# Altium footprint library ref-packages-longpad.PCBLIB: 1527 footprints (part 46 of 103) (continued)
## QFP120_SOT349-2 [mm]
pads (120):
  rect 0.6x1.5 smd: 1(-11.6,-16.2) 30(11.6,-16.2) 61(11.6,16.2) 90(-11.6,16.2)
  rect 0.5x1.5 smd: 2(-10.8,-16.2) 3(-10,-16.2) 4(-9.2,-16.2) 5(-8.4,-16.2) 6(-7.6,-16.2) 7(-6.8,-16.2) 8(-6,-16.2) 9(-5.2,-16.2) 10(-4.4,-16.2) 11(-3.6,-16.2) 12(-2.8,-16.2) 13(-2,-16.2) 14(-1.2,-16.2) 15(-0.4,-16.2) 16(0.4,-16.2) 17(1.2,-16.2) 18(2,-16.2) 19(2.8,-16.2) 20(3.6,-16.2) 21(4.4,-16.2) 22(5.2,-16.2) 23(6,-16.2) 24(6.8,-16.2) 25(7.6,-16.2) 26(8.4,-16.2) 27(9.2,-16.2) 28(10,-16.2) 29(10.8,-16.2) 62(10.8,16.2) 63(10,16.2) 64(9.2,16.2) 65(8.4,16.2) 66(7.6,16.2) 67(6.8,16.2) 68(6,16.2) 69(5.2,16.2) 70(4.4,16.2) 71(3.6,16.2) 72(2.8,16.2) 73(2,16.2) 74(1.2,16.2) 75(0.4,16.2) 76(-0.4,16.2) 77(-1.2,16.2) 78(-2,16.2) 79(-2.8,16.2) 80(-3.6,16.2) 81(-4.4,16.2) 82(-5.2,16.2) 83(-6,16.2) 84(-6.8,16.2) 85(-7.6,16.2) 86(-8.4,16.2) 87(-9.2,16.2) 88(-10,16.2) 89(-10.8,16.2)
  rect 1.5x0.6 smd: 31(16.2,-11.6) 60(16.2,11.6) 91(-16.2,11.6) 120(-16.2,-11.6)
  rect 1.5x0.5 smd: 32(16.2,-10.8) 33(16.2,-10) 34(16.2,-9.2) 35(16.2,-8.4) 36(16.2,-7.6) 37(16.2,-6.8) 38(16.2,-6) 39(16.2,-5.2) 40(16.2,-4.4) 41(16.2,-3.6) 42(16.2,-2.8) 43(16.2,-2) 44(16.2,-1.2) 45(16.2,-0.4) 46(16.2,0.4) 47(16.2,1.2) 48(16.2,2) 49(16.2,2.8) 50(16.2,3.6) 51(16.2,4.4) 52(16.2,5.2) 53(16.2,6) 54(16.2,6.8) 55(16.2,7.6) 56(16.2,8.4) 57(16.2,9.2) 58(16.2,10) 59(16.2,10.8) 92(-16.2,10.8) 93(-16.2,10) 94(-16.2,9.2) 95(-16.2,8.4) 96(-16.2,7.6) 97(-16.2,6.8) 98(-16.2,6) 99(-16.2,5.2) 100(-16.2,4.4) 101(-16.2,3.6) 102(-16.2,2.8) 103(-16.2,2) 104(-16.2,1.2) 105(-16.2,0.4) 106(-16.2,-0.4) 107(-16.2,-1.2) 108(-16.2,-2) 109(-16.2,-2.8) 110(-16.2,-3.6) 111(-16.2,-4.4) 112(-16.2,-5.2) 113(-16.2,-6) 114(-16.2,-6.8) 115(-16.2,-7.6) 116(-16.2,-8.4) 117(-16.2,-9.2) 118(-16.2,-10) 119(-16.2,-10.8)
Top Overlay:
  circle w0.203: c-11.8,-11.8 r0.6
  lines w0.203: -14.1,-14.1 14.1,-14.1 14.1,14.1 -14.1,14.1 -14.1,-14.1
Mechanical 16:
  rectangle: -11.8,-16.55 -11.4,-14.2
  rectangle: -11,-16.55 -10.6,-14.2
  rectangle: -10.2,-16.55 -9.8,-14.2
  rectangle: -9.4,-16.55 -9,-14.2
  rectangle: -8.6,-16.55 -8.2,-14.2
  rectangle: -7.8,-16.55 -7.4,-14.2
  rectangle: -7,-16.55 -6.6,-14.2
  rectangle: -6.2,-16.55 -5.8,-14.2
  rectangle: -5.4,-16.55 -5,-14.2
  rectangle: -4.6,-16.55 -4.2,-14.2
  rectangle: -3.8,-16.55 -3.4,-14.2
  rectangle: -3,-16.55 -2.6,-14.2
  rectangle: -2.2,-16.55 -1.8,-14.2
  rectangle: -1.4,-16.55 -1,-14.2
  rectangle: -0.6,-16.55 -0.2,-14.2
  rectangle: 0.2,-16.55 0.6,-14.2
  rectangle: 1,-16.55 1.4,-14.2
  rectangle: 1.8,-16.55 2.2,-14.2
  rectangle: 2.6,-16.55 3,-14.2
  rectangle: 3.4,-16.55 3.8,-14.2
  rectangle: 4.2,-16.55 4.6,-14.2
  rectangle: 5,-16.55 5.4,-14.2
  rectangle: 5.8,-16.55 6.2,-14.2
  rectangle: 6.6,-16.55 7,-14.2
  rectangle: 7.4,-16.55 7.8,-14.2
  rectangle: 8.2,-16.55 8.6,-14.2
  rectangle: 9,-16.55 9.4,-14.2
  rectangle: 9.8,-16.55 10.2,-14.2
  rectangle: 10.6,-16.55 11,-14.2
  rectangle: 11.4,-16.55 11.8,-14.2
  rectangle: 14.2,-11.8 16.55,-11.4
  rectangle: 14.2,-11 16.55,-10.6
  rectangle: 14.2,-10.2 16.55,-9.8
  rectangle: 14.2,-9.4 16.55,-9
  rectangle: 14.2,-8.6 16.55,-8.2
  rectangle: 14.2,-7.8 16.55,-7.4
  rectangle: 14.2,-7 16.55,-6.6
  rectangle: 14.2,-6.2 16.55,-5.8
  rectangle: 14.2,-5.4 16.55,-5
  rectangle: 14.2,-4.6 16.55,-4.2
  rectangle: 14.2,-3.8 16.55,-3.4
  rectangle: 14.2,-3 16.55,-2.6
  rectangle: 14.2,-2.2 16.55,-1.8
  rectangle: 14.2,-1.4 16.55,-1
  rectangle: 14.2,-0.6 16.55,-0.2
  rectangle: 14.2,0.2 16.55,0.6
  rectangle: 14.2,1 16.55,1.4
  rectangle: 14.2,1.8 16.55,2.2
  rectangle: 14.2,2.6 16.55,3
  rectangle: 14.2,3.4 16.55,3.8
  rectangle: 14.2,4.2 16.55,4.6
  rectangle: 14.2,5 16.55,5.4
  rectangle: 14.2,5.8 16.55,6.2
  rectangle: 14.2,6.6 16.55,7
  rectangle: 14.2,7.4 16.55,7.8
  rectangle: 14.2,8.2 16.55,8.6
  rectangle: 14.2,9 16.55,9.4
  rectangle: 14.2,9.8 16.55,10.2
  rectangle: 14.2,10.6 16.55,11
  rectangle: 14.2,11.4 16.55,11.8
  rectangle: 11.4,14.2 11.8,16.55
  rectangle: 10.6,14.2 11,16.55
  rectangle: 9.8,14.2 10.2,16.55
  rectangle: 9,14.2 9.4,16.55
  rectangle: 8.2,14.2 8.6,16.55
  rectangle: 7.4,14.2 7.8,16.55
  rectangle: 6.6,14.2 7,16.55
  rectangle: 5.8,14.2 6.2,16.55
  rectangle: 5,14.2 5.4,16.55
  rectangle: 4.2,14.2 4.6,16.55
  rectangle: 3.4,14.2 3.8,16.55
  rectangle: 2.6,14.2 3,16.55
  rectangle: 1.8,14.2 2.2,16.55
  rectangle: 1,14.2 1.4,16.55
  rectangle: 0.2,14.2 0.6,16.55
  rectangle: -0.6,14.2 -0.2,16.55
  rectangle: -1.4,14.2 -1,16.55
  rectangle: -2.2,14.2 -1.8,16.55
  rectangle: -3,14.2 -2.6,16.55
  rectangle: -3.8,14.2 -3.4,16.55
  rectangle: -4.6,14.2 -4.2,16.55
  rectangle: -5.4,14.2 -5,16.55
  rectangle: -6.2,14.2 -5.8,16.55
  rectangle: -7,14.2 -6.6,16.55
  rectangle: -7.8,14.2 -7.4,16.55
  rectangle: -8.6,14.2 -8.2,16.55
  rectangle: -9.4,14.2 -9,16.55
  rectangle: -10.2,14.2 -9.8,16.55
  rectangle: -11,14.2 -10.6,16.55
  rectangle: -11.8,14.2 -11.4,16.55
  rectangle: -16.55,11.4 -14.2,11.8
  rectangle: -16.55,10.6 -14.2,11
  rectangle: -16.55,9.8 -14.2,10.2
  rectangle: -16.55,9 -14.2,9.4
  rectangle: -16.55,8.2 -14.2,8.6
  rectangle: -16.55,7.4 -14.2,7.8
  rectangle: -16.55,6.6 -14.2,7
  rectangle: -16.55,5.8 -14.2,6.2
  rectangle: -16.55,5 -14.2,5.4
  rectangle: -16.55,4.2 -14.2,4.6
  rectangle: -16.55,3.4 -14.2,3.8
  rectangle: -16.55,2.6 -14.2,3
  rectangle: -16.55,1.8 -14.2,2.2
  rectangle: -16.55,1 -14.2,1.4
  rectangle: -16.55,0.2 -14.2,0.6
  rectangle: -16.55,-0.6 -14.2,-0.2
  rectangle: -16.55,-1.4 -14.2,-1
  rectangle: -16.55,-2.2 -14.2,-1.8
  rectangle: -16.55,-3 -14.2,-2.6
  rectangle: -16.55,-3.8 -14.2,-3.4
  rectangle: -16.55,-4.6 -14.2,-4.2
  rectangle: -16.55,-5.4 -14.2,-5
  rectangle: -16.55,-6.2 -14.2,-5.8
  rectangle: -16.55,-7 -14.2,-6.6
  rectangle: -16.55,-7.8 -14.2,-7.4
  rectangle: -16.55,-8.6 -14.2,-8.2
  rectangle: -16.55,-9.4 -14.2,-9
  rectangle: -16.55,-10.2 -14.2,-9.8
  rectangle: -16.55,-11 -14.2,-10.6
  rectangle: -16.55,-11.8 -14.2,-11.4

## QFP128_SOT320-2 [mm]
pads (128):
  rect 0.6x1.5 smd: 1(-12.4,-15.1) 32(12.4,-15.1) 65(12.4,15.1) 96(-12.4,15.1)
  rect 0.5x1.5 smd: 2(-11.6,-15.1) 3(-10.8,-15.1) 4(-10,-15.1) 5(-9.2,-15.1) 6(-8.4,-15.1) 7(-7.6,-15.1) 8(-6.8,-15.1) 9(-6,-15.1) 10(-5.2,-15.1) 11(-4.4,-15.1) 12(-3.6,-15.1) 13(-2.8,-15.1) 14(-2,-15.1) 15(-1.2,-15.1) 16(-0.4,-15.1) 17(0.4,-15.1) 18(1.2,-15.1) 19(2,-15.1) 20(2.8,-15.1) 21(3.6,-15.1) 22(4.4,-15.1) 23(5.2,-15.1) 24(6,-15.1) 25(6.8,-15.1) 26(7.6,-15.1) 27(8.4,-15.1) 28(9.2,-15.1) 29(10,-15.1) 30(10.8,-15.1) 31(11.6,-15.1) 66(11.6,15.1) 67(10.8,15.1) 68(10,15.1) 69(9.2,15.1) 70(8.4,15.1) 71(7.6,15.1) 72(6.8,15.1) 73(6,15.1) 74(5.2,15.1) 75(4.4,15.1) 76(3.6,15.1) 77(2.8,15.1) 78(2,15.1) 79(1.2,15.1) 80(0.4,15.1) 81(-0.4,15.1) 82(-1.2,15.1) 83(-2,15.1) 84(-2.8,15.1) 85(-3.6,15.1) 86(-4.4,15.1) 87(-5.2,15.1) 88(-6,15.1) 89(-6.8,15.1) 90(-7.6,15.1) 91(-8.4,15.1) 92(-9.2,15.1) 93(-10,15.1) 94(-10.8,15.1) 95(-11.6,15.1)
  rect 1.5x0.6 smd: 33(15.1,-12.4) 64(15.1,12.4) 97(-15.1,12.4) 128(-15.1,-12.4)
  rect 1.5x0.5 smd: 34(15.1,-11.6) 35(15.1,-10.8) 36(15.1,-10) 37(15.1,-9.2) 38(15.1,-8.4) 39(15.1,-7.6) 40(15.1,-6.8) 41(15.1,-6) 42(15.1,-5.2) 43(15.1,-4.4) 44(15.1,-3.6) 45(15.1,-2.8) 46(15.1,-2) 47(15.1,-1.2) 48(15.1,-0.4) 49(15.1,0.4) 50(15.1,1.2) 51(15.1,2) 52(15.1,2.8) 53(15.1,3.6) 54(15.1,4.4) 55(15.1,5.2) 56(15.1,6) 57(15.1,6.8) 58(15.1,7.6) 59(15.1,8.4) 60(15.1,9.2) 61(15.1,10) 62(15.1,10.8) 63(15.1,11.6) 98(-15.1,11.6) 99(-15.1,10.8) 100(-15.1,10) 101(-15.1,9.2) 102(-15.1,8.4) 103(-15.1,7.6) 104(-15.1,6.8) 105(-15.1,6) 106(-15.1,5.2) 107(-15.1,4.4) 108(-15.1,3.6) 109(-15.1,2.8) 110(-15.1,2) 111(-15.1,1.2) 112(-15.1,0.4) 113(-15.1,-0.4) 114(-15.1,-1.2) 115(-15.1,-2) 116(-15.1,-2.8) 117(-15.1,-3.6) 118(-15.1,-4.4) 119(-15.1,-5.2) 120(-15.1,-6) 121(-15.1,-6.8) 122(-15.1,-7.6) 123(-15.1,-8.4) 124(-15.1,-9.2) 125(-15.1,-10) 126(-15.1,-10.8) 127(-15.1,-11.6)
Top Overlay:
  circle w0.203: c-12.4,-12.4 r0.51
  lines w0.203: -14.2,-14.2 14.2,-14.2 14.2,14.2 -14.2,14.2 -14.2,-14.2
Mechanical 16:
  rectangle: -12.6,-15.45 -12.2,-14.25
  rectangle: -11.8,-15.45 -11.4,-14.25
  rectangle: -11,-15.45 -10.6,-14.25
  rectangle: -10.2,-15.45 -9.8,-14.25
  rectangle: -9.4,-15.45 -9,-14.25
  rectangle: -8.6,-15.45 -8.2,-14.25
  rectangle: -7.8,-15.45 -7.4,-14.25
  rectangle: -7,-15.45 -6.6,-14.25
  rectangle: -6.2,-15.45 -5.8,-14.25
  rectangle: -5.4,-15.45 -5,-14.25
  rectangle: -4.6,-15.45 -4.2,-14.25
  rectangle: -3.8,-15.45 -3.4,-14.25
  rectangle: -3,-15.45 -2.6,-14.25
  rectangle: -2.2,-15.45 -1.8,-14.25
  rectangle: -1.4,-15.45 -1,-14.25
  rectangle: -0.6,-15.45 -0.2,-14.25
  rectangle: 0.2,-15.45 0.6,-14.25
  rectangle: 1,-15.45 1.4,-14.25
  rectangle: 1.8,-15.45 2.2,-14.25
  rectangle: 2.6,-15.45 3,-14.25
  rectangle: 3.4,-15.45 3.8,-14.25
  rectangle: 4.2,-15.45 4.6,-14.25
  rectangle: 5,-15.45 5.4,-14.25
  rectangle: 5.8,-15.45 6.2,-14.25
  rectangle: 6.6,-15.45 7,-14.25
  rectangle: 7.4,-15.45 7.8,-14.25
  rectangle: 8.2,-15.45 8.6,-14.25
  rectangle: 9,-15.45 9.4,-14.25
  rectangle: 9.8,-15.45 10.2,-14.25
  rectangle: 10.6,-15.45 11,-14.25
  rectangle: 11.4,-15.45 11.8,-14.25
  rectangle: 12.2,-15.45 12.6,-14.25
  rectangle: 14.25,-12.6 15.45,-12.2
  rectangle: 14.25,-11.8 15.45,-11.4
  rectangle: 14.25,-11 15.45,-10.6
  rectangle: 14.25,-10.2 15.45,-9.8
  rectangle: 14.25,-9.4 15.45,-9
  rectangle: 14.25,-8.6 15.45,-8.2
  rectangle: 14.25,-7.8 15.45,-7.4
  rectangle: 14.25,-7 15.45,-6.6
  rectangle: 14.25,-6.2 15.45,-5.8
  rectangle: 14.25,-5.4 15.45,-5
  rectangle: 14.25,-4.6 15.45,-4.2
  rectangle: 14.25,-3.8 15.45,-3.4
  rectangle: 14.25,-3 15.45,-2.6
  rectangle: 14.25,-2.2 15.45,-1.8
  rectangle: 14.25,-1.4 15.45,-1
  rectangle: 14.25,-0.6 15.45,-0.2
  rectangle: 14.25,0.2 15.45,0.6
  rectangle: 14.25,1 15.45,1.4
  rectangle: 14.25,1.8 15.45,2.2
  rectangle: 14.25,2.6 15.45,3
  rectangle: 14.25,3.4 15.45,3.8
  rectangle: 14.25,4.2 15.45,4.6
  rectangle: 14.25,5 15.45,5.4
  rectangle: 14.25,5.8 15.45,6.2
  rectangle: 14.25,6.6 15.45,7
  rectangle: 14.25,7.4 15.45,7.8
  rectangle: 14.25,8.2 15.45,8.6
  rectangle: 14.25,9 15.45,9.4
  rectangle: 14.25,9.8 15.45,10.2
  rectangle: 14.25,10.6 15.45,11
  rectangle: 14.25,11.4 15.45,11.8
  rectangle: 14.25,12.2 15.45,12.6
  rectangle: 12.2,14.25 12.6,15.45
  rectangle: 11.4,14.25 11.8,15.45
  rectangle: 10.6,14.25 11,15.45
  rectangle: 9.8,14.25 10.2,15.45
  rectangle: 9,14.25 9.4,15.45
  rectangle: 8.2,14.25 8.6,15.45
  rectangle: 7.4,14.25 7.8,15.45
  rectangle: 6.6,14.25 7,15.45
  rectangle: 5.8,14.25 6.2,15.45
  rectangle: 5,14.25 5.4,15.45
  rectangle: 4.2,14.25 4.6,15.45
  rectangle: 3.4,14.25 3.8,15.45
  rectangle: 2.6,14.25 3,15.45
  rectangle: 1.8,14.25 2.2,15.45
  rectangle: 1,14.25 1.4,15.45
  rectangle: 0.2,14.25 0.6,15.45
  rectangle: -0.6,14.25 -0.2,15.45
  rectangle: -1.4,14.25 -1,15.45
  rectangle: -2.2,14.25 -1.8,15.45
  rectangle: -3,14.25 -2.6,15.45
  rectangle: -3.8,14.25 -3.4,15.45
  rectangle: -4.6,14.25 -4.2,15.45
  rectangle: -5.4,14.25 -5,15.45
  rectangle: -6.2,14.25 -5.8,15.45
  rectangle: -7,14.25 -6.6,15.45
  rectangle: -7.8,14.25 -7.4,15.45
  rectangle: -8.6,14.25 -8.2,15.45
  rectangle: -9.4,14.25 -9,15.45
  rectangle: -10.2,14.25 -9.8,15.45
  rectangle: -11,14.25 -10.6,15.45
  rectangle: -11.8,14.25 -11.4,15.45
  rectangle: -12.6,14.25 -12.2,15.45
  rectangle: -15.45,12.2 -14.25,12.6
  rectangle: -15.45,11.4 -14.25,11.8
  rectangle: -15.45,10.6 -14.25,11
  rectangle: -15.45,9.8 -14.25,10.2
  rectangle: -15.45,9 -14.25,9.4
  rectangle: -15.45,8.2 -14.25,8.6
  rectangle: -15.45,7.4 -14.25,7.8
  rectangle: -15.45,6.6 -14.25,7
  rectangle: -15.45,5.8 -14.25,6.2
  rectangle: -15.45,5 -14.25,5.4
  rectangle: -15.45,4.2 -14.25,4.6
  rectangle: -15.45,3.4 -14.25,3.8
  rectangle: -15.45,2.6 -14.25,3
  rectangle: -15.45,1.8 -14.25,2.2
  rectangle: -15.45,1 -14.25,1.4
  rectangle: -15.45,0.2 -14.25,0.6
  rectangle: -15.45,-0.6 -14.25,-0.2
  rectangle: -15.45,-1.4 -14.25,-1
  rectangle: -15.45,-2.2 -14.25,-1.8
  rectangle: -15.45,-3 -14.25,-2.6
  rectangle: -15.45,-3.8 -14.25,-3.4
  rectangle: -15.45,-4.6 -14.25,-4.2
  rectangle: -15.45,-5.4 -14.25,-5
  rectangle: -15.45,-6.2 -14.25,-5.8
  rectangle: -15.45,-7 -14.25,-6.6
  rectangle: -15.45,-7.8 -14.25,-7.4
  rectangle: -15.45,-8.6 -14.25,-8.2
  rectangle: -15.45,-9.4 -14.25,-9
  rectangle: -15.45,-10.2 -14.25,-9.8
  rectangle: -15.45,-11 -14.25,-10.6
  rectangle: -15.45,-11.8 -14.25,-11.4
  rectangle: -15.45,-12.6 -14.25,-12.2

## QFP132 [mil]
pads (132):
  rect 14x75 smd: 1(-402,-537) 2(-377,-537) 3(-352,-537) 4(-327,-537) 5(-302,-537) 6(-277,-537) 7(-252,-537) 8(-227,-537) 9(-202,-537) 10(-177,-537) 11(-152,-537) 12(-127,-537) 13(-102,-537) 14(-77,-537) 15(-52,-537) 16(-27,-537) 17(-2,-537) 18(23,-537) 19(48,-537) 20(73,-537) 21(98,-537) 22(123,-537) 23(148,-537) 24(173,-537) 25(198,-537) 26(223,-537) 27(248,-537) 28(273,-537) 29(298,-537) 30(323,-537) 31(348,-537) 32(373,-537) 33(398,-537) 67(398,542) 68(373,542) 69(348,542) 70(323,542) 71(298,542) 72(273,542) 73(248,542) 74(223,542) 75(198,542) 76(173,542) 77(148,542) 78(123,542) 79(98,542) 80(73,542) 81(48,542) 82(23,542) 83(-2,542) 84(-27,542) 85(-52,542) 86(-77,542) 87(-102,542) 88(-127,542) 89(-152,542) 90(-177,542) 91(-202,542) 92(-227,542) 93(-252,542) 94(-277,542) 95(-302,542) 96(-327,542) 97(-352,542) 98(-377,542) 99(-402,542)
  rect 75x14 smd: 34(536,-379) 35(536,-354) 36(536,-329) 37(536,-304) 38(536,-279) 39(536,-254) 40(536,-229) 41(536,-204) 42(536,-179) 43(536,-154) 44(536,-129) 45(536,-104) 46(536,-79) 47(536,-54) 48(536,-29) 49(536,-4) 50(536,21) 51(536,46) 52(536,71) 53(536,96) 54(536,121) 55(536,146) 56(536,171) 57(536,196) 58(536,221) 59(536,246) 60(536,271) 61(536,296) 62(536,321) 63(536,346) 64(536,371) 65(536,396) 66(536,421) 100(-544,422) 101(-544,397) 102(-544,372) 103(-544,347) 104(-544,322) 105(-544,297) 106(-544,272) 107(-544,247) 108(-544,222) 109(-544,197) 110(-544,172) 111(-544,147) 112(-544,122) 113(-544,97) 114(-544,72) 115(-544,47) 116(-544,22) 117(-544,-3) 118(-544,-28) 119(-544,-53) 120(-544,-78) 121(-544,-103) 122(-544,-128) 123(-544,-153) 124(-544,-178) 125(-544,-203) 126(-544,-228) 127(-544,-253) 128(-544,-278) 129(-544,-303) 130(-544,-328) 131(-544,-353) 132(-544,-378)
Top Overlay:
  circle w2: c-420,-411 r14
  lines w2: -478,-445 -457,-428 ; -478,477 -457,457 ; -453,-472 -433,-449 ; 471,477 452,457 ; -457,-428 -457,457 ; -457,-428 -433,-449 ; -457,457 452,457 ; -433,-449 452,-449 452,457
  lines w6: 452,-449 471,-472 ; 471,-472 471,477 -478,477 -478,-445 -453,-472 471,-472
Mechanical 16:
  rectangle: 473,415 558,427
  rectangle: 473,390 558,402
  rectangle: 473,365 558,377
  rectangle: 473,340 558,352
  rectangle: 473,315 558,327
  rectangle: 473,290 558,302
  rectangle: 473,265 558,277
  rectangle: 473,240 558,252
  rectangle: 473,215 558,227
  rectangle: 473,190 558,202
  rectangle: 473,165 558,177
  rectangle: 473,140 558,152
  rectangle: 473,115 558,127
  rectangle: 473,90 558,102
  rectangle: 473,65 558,77
  rectangle: 473,40 558,52
  rectangle: 473,15 558,27
  rectangle: 473,-10 558,2
  rectangle: 473,-35 558,-23
  rectangle: 473,-60 558,-48
  rectangle: 473,-85 558,-73
  rectangle: 473,-110 558,-98
  rectangle: 473,-135 558,-123
  rectangle: 473,-160 558,-148
  rectangle: 473,-185 558,-173
  rectangle: 473,-210 558,-198
  rectangle: 473,-235 558,-223
  rectangle: 473,-260 558,-248
  rectangle: 473,-285 558,-273
  rectangle: 473,-310 558,-298
  rectangle: 473,-335 558,-323
  rectangle: 473,-360 558,-348
  rectangle: 473,-385 558,-373
  rectangle: 317,479 329,564
  rectangle: 292,479 304,564
  rectangle: 267,479 279,564
  rectangle: 242,479 254,564
  rectangle: 217,479 229,564
  rectangle: 192,479 204,564
  rectangle: 167,479 179,564
  rectangle: 142,479 154,564
  rectangle: 117,479 129,564
  rectangle: 92,479 104,564
  rectangle: 67,479 79,564
  rectangle: 42,479 54,564
  rectangle: 17,479 29,564
  rectangle: -8,479 4,564
  rectangle: -33,479 -21,564
  rectangle: -58,479 -46,564
  rectangle: -83,479 -71,564
  rectangle: -108,479 -96,564
  rectangle: -133,479 -121,564
  rectangle: -158,479 -146,564
  rectangle: -183,479 -171,564
  rectangle: -208,479 -196,564
  rectangle: -233,479 -221,564
  rectangle: -258,479 -246,564
  rectangle: -283,479 -271,564
  rectangle: -308,479 -296,564
  rectangle: -333,479 -321,564
  rectangle: -358,479 -346,564
  rectangle: -383,479 -371,564
  rectangle: -408,479 -396,564
  rectangle: 342,479 354,564
  rectangle: 367,479 379,564
  rectangle: 392,479 404,564
  rectangle: -565,416 -480,428
  rectangle: -565,391 -480,403
  rectangle: -565,366 -480,378
  rectangle: -565,341 -480,353
  rectangle: -565,316 -480,328
  rectangle: -565,291 -480,303
  rectangle: -565,266 -480,278
  rectangle: -565,241 -480,253
  rectangle: -565,216 -480,228
  rectangle: -565,191 -480,203
  rectangle: -565,166 -480,178
  rectangle: -565,141 -480,153
  rectangle: -565,116 -480,128
  rectangle: -565,91 -480,103
  rectangle: -565,66 -480,78
  rectangle: -565,41 -480,53
  rectangle: -565,16 -480,28
  rectangle: -565,-9 -480,3
  rectangle: -565,-34 -480,-22
  rectangle: -565,-59 -480,-47
  rectangle: -565,-84 -480,-72
  rectangle: -565,-109 -480,-97
  rectangle: -565,-134 -480,-122
  rectangle: -565,-159 -480,-147
  rectangle: -565,-184 -480,-172
  rectangle: -565,-209 -480,-197
  rectangle: -565,-234 -480,-222
  rectangle: -565,-259 -480,-247
  rectangle: -565,-284 -480,-272
  rectangle: -565,-309 -480,-297
  rectangle: -565,-334 -480,-322
  rectangle: -565,-359 -480,-347
  rectangle: -565,-384 -480,-372
  rectangle: 392,-559 404,-474
  rectangle: 367,-559 379,-474
  rectangle: 342,-559 354,-474
  rectangle: 317,-559 329,-474
  rectangle: 292,-559 304,-474
  rectangle: 267,-559 279,-474
  rectangle: 242,-559 254,-474
  rectangle: 217,-559 229,-474
  rectangle: 192,-559 204,-474
  rectangle: 167,-559 179,-474
  rectangle: 142,-559 154,-474
  rectangle: 117,-559 129,-474
  rectangle: 92,-559 104,-474
  rectangle: 67,-559 79,-474
  rectangle: 42,-559 54,-474
  rectangle: 17,-559 29,-474
  rectangle: -8,-559 4,-474
  rectangle: -33,-559 -21,-474
  rectangle: -58,-559 -46,-474
  rectangle: -83,-559 -71,-474
  rectangle: -108,-559 -96,-474
  rectangle: -133,-559 -121,-474
  rectangle: -158,-559 -146,-474
  rectangle: -183,-559 -171,-474
  rectangle: -208,-559 -196,-474
  rectangle: -233,-559 -221,-474
  rectangle: -258,-559 -246,-474
  rectangle: -283,-559 -271,-474
  rectangle: -308,-559 -296,-474
  rectangle: -333,-559 -321,-474
  rectangle: -358,-559 -346,-474
  rectangle: -383,-559 -371,-474
  rectangle: -408,-559 -396,-474

## QFP256-28X28 [mm]
pads (256):
  rect 0.9x0.22 smd: 1(-14.975,12.6) 2(-14.975,12.2) 3(-14.975,11.8) 4(-14.975,11.4) 5(-14.975,11) 6(-14.975,10.6) 7(-14.975,10.2) 8(-14.975,9.8) 9(-14.975,9.4) 10(-14.975,9) 11(-14.975,8.6) 12(-14.975,8.2) 13(-14.975,7.8) 14(-14.975,7.4) 15(-14.975,7) 16(-14.975,6.6) 17(-14.975,6.2) 18(-14.975,5.8) 19(-14.975,5.4) 20(-14.975,5) 21(-14.975,4.6) 22(-14.975,4.2) 23(-14.975,3.8) 24(-14.975,3.4) 25(-14.975,3) 26(-14.975,2.6) 27(-14.975,2.2) 28(-14.975,1.8) 29(-14.975,1.4) 30(-14.975,1) 31(-14.975,0.6) 32(-14.975,0.2) 33(-14.975,-0.2) 34(-14.975,-0.6) 35(-14.975,-1) 36(-14.975,-1.4) 37(-14.975,-1.8) 38(-14.975,-2.2) 39(-14.975,-2.6) 40(-14.975,-3) 41(-14.975,-3.4) 42(-14.975,-3.8) 43(-14.975,-4.2) 44(-14.975,-4.6) 45(-14.975,-5) 46(-14.975,-5.4) 47(-14.975,-5.8) 48(-14.975,-6.2) 49(-14.975,-6.6) 50(-14.975,-7) 51(-14.975,-7.4) 52(-14.975,-7.8) 53(-14.975,-8.2) 54(-14.975,-8.6) 55(-14.975,-9) 56(-14.975,-9.4) 57(-14.975,-9.8) 58(-14.975,-10.2) 59(-14.975,-10.6) 60(-14.975,-11) 61(-14.975,-11.4) 62(-14.975,-11.8) 63(-14.975,-12.2) 64(-14.975,-12.6) 129(14.975,-12.6) 130(14.975,-12.2) 131(14.975,-11.8) 132(14.975,-11.4) 133(14.975,-11) 134(14.975,-10.6) 135(14.975,-10.2) 136(14.975,-9.8) 137(14.975,-9.4) 138(14.975,-9) 139(14.975,-8.6) 140(14.975,-8.2) 141(14.975,-7.8) 142(14.975,-7.4) 143(14.975,-7) 144(14.975,-6.6) 145(14.975,-6.2) 146(14.975,-5.8) 147(14.975,-5.4) 148(14.975,-5) 149(14.975,-4.6) 150(14.975,-4.2) 151(14.975,-3.8) 152(14.975,-3.4) 153(14.975,-3) 154(14.975,-2.6) 155(14.975,-2.2) 156(14.975,-1.8) 157(14.975,-1.4) 158(14.975,-1) 159(14.975,-0.6) 160(14.975,-0.2) 161(14.975,0.2) 162(14.975,0.6) 163(14.975,1) 164(14.975,1.4) 165(14.975,1.8) 166(14.975,2.2) 167(14.975,2.6) 168(14.975,3) 169(14.975,3.4) 170(14.975,3.8) 171(14.975,4.2) 172(14.975,4.6) 173(14.975,5) 174(14.975,5.4) 175(14.975,5.8) 176(14.975,6.2) 177(14.975,6.6) 178(14.975,7) 179(14.975,7.4) 180(14.975,7.8) 181(14.975,8.2) 182(14.975,8.6) 183(14.975,9) 184(14.975,9.4) 185(14.975,9.8) 186(14.975,10.2) 187(14.975,10.6) 188(14.975,11) 189(14.975,11.4) 190(14.975,11.8) 191(14.975,12.2) 192(14.975,12.6)
  rect 0.22x0.9 smd: 65(-12.6,-14.975) 66(-12.2,-14.975) 67(-11.8,-14.975) 68(-11.4,-14.975) 69(-11,-14.975) 70(-10.6,-14.975) 71(-10.2,-14.975) 72(-9.8,-14.975) 73(-9.4,-14.975) 74(-9,-14.975) 75(-8.6,-14.975) 76(-8.2,-14.975) 77(-7.8,-14.975) 78(-7.4,-14.975) 79(-7,-14.975) 80(-6.6,-14.975) 81(-6.2,-14.975) 82(-5.8,-14.975) 83(-5.4,-14.975) 84(-5,-14.975) 85(-4.6,-14.975) 86(-4.2,-14.975) 87(-3.8,-14.975) 88(-3.4,-14.975) 89(-3,-14.975) 90(-2.6,-14.975) 91(-2.2,-14.975) 92(-1.8,-14.975) 93(-1.4,-14.975) 94(-1,-14.975) 95(-0.6,-14.975) 96(-0.2,-14.975) 97(0.2,-14.975) 98(0.6,-14.975) 99(1,-14.975) 100(1.4,-14.975) 101(1.8,-14.975) 102(2.2,-14.975) 103(2.6,-14.975) 104(3,-14.975) 105(3.4,-14.975) 106(3.8,-14.975) 107(4.2,-14.975) 108(4.6,-14.975) 109(5,-14.975) 110(5.4,-14.975) 111(5.8,-14.975) 112(6.2,-14.975) 113(6.6,-14.975) 114(7,-14.975) 115(7.4,-14.975) 116(7.8,-14.975) 117(8.2,-14.975) 118(8.6,-14.975) 119(9,-14.975) 120(9.4,-14.975) 121(9.8,-14.975) 122(10.2,-14.975) 123(10.6,-14.975) 124(11,-14.975) 125(11.4,-14.975) 126(11.8,-14.975) 127(12.2,-14.975) 128(12.6,-14.975) 193(12.6,14.975) 194(12.2,14.975) 195(11.8,14.975) 196(11.4,14.975) 197(11,14.975) 198(10.6,14.975) 199(10.2,14.975) 200(9.8,14.975) 201(9.4,14.975) 202(9,14.975) 203(8.6,14.975) 204(8.2,14.975) 205(7.8,14.975) 206(7.4,14.975) 207(7,14.975) 208(6.6,14.975) 209(6.2,14.975) 210(5.8,14.975) 211(5.4,14.975) 212(5,14.975) 213(4.6,14.975) 214(4.2,14.975) 215(3.8,14.975) 216(3.4,14.975) 217(3,14.975) 218(2.6,14.975) 219(2.2,14.975) 220(1.8,14.975) 221(1.4,14.975) 222(1,14.975) 223(0.6,14.975) 224(0.2,14.975) 225(-0.2,14.975) 226(-0.6,14.975) 227(-1,14.975) 228(-1.4,14.975) 229(-1.8,14.975) 230(-2.2,14.975) 231(-2.6,14.975) 232(-3,14.975) 233(-3.4,14.975) 234(-3.8,14.975) 235(-4.2,14.975) 236(-4.6,14.975) 237(-5,14.975) 238(-5.4,14.975) 239(-5.8,14.975) 240(-6.2,14.975) 241(-6.6,14.975) 242(-7,14.975) 243(-7.4,14.975) 244(-7.8,14.975) 245(-8.2,14.975) 246(-8.6,14.975) 247(-9,14.975) 248(-9.4,14.975) 249(-9.8,14.975) 250(-10.2,14.975) 251(-10.6,14.975) 252(-11,14.975) 253(-11.4,14.975) 254(-11.8,14.975) 255(-12.2,14.975) 256(-12.6,14.975)
Top Overlay:
  circle w0: c-13.05,13.05 r0.354
  lines w0.203: -13.9,-13.9 13.9,-13.9 13.9,13.9 -13.45,13.9 -13.9,13.45 -13.9,-13.9
Top Solder:
  drawing of 256 lines, arcs and shapes, not listed
Mechanical 16:
  drawing of 256 lines, arcs and shapes, not listed

## QFP-32 [mil]
pads (32):
  rect 15.75x86.61 smd: 1(-94.49,-183.07) 2(-62.99,-183.07) 3(-31.5,-183.07) 4(0,-183.07) 5(31.5,-183.07) 6(62.99,-183.07) 7(94.49,-183.07) 8(125.98,-183.07) 17(125.98,214.57) 18(94.49,214.57) 19(62.99,214.57) 20(31.5,214.57) 21(0,214.57) 22(-31.5,214.57) 23(-62.99,214.57) 24(-94.49,214.57)
  rect 86.61x15.75 smd: 9(214.57,-94.49) 10(214.57,-62.99) 11(214.57,-31.5) 12(214.57,0) 13(214.57,31.5) 14(214.57,62.99) 15(214.57,94.49) 16(214.57,125.98) 25(-183.07,125.98) 26(-183.07,94.49) 27(-183.07,62.99) 28(-183.07,31.5) 29(-183.07,0) 30(-183.07,-31.5) 31(-183.07,-62.99) 32(-183.07,-94.49)
Top Overlay:
  circle w2: c-62.6,-57.91 r29.53
  circle w2: c-62.6,-57.91 r19.69
  lines w2: -124.02,-104.33 -104.33,-88.58 ; -124.02,135.83 -104.33,117.72 ; -104.33,-124.02 -86.22,-104.33 ; -104.33,155.51 -86.22,135.83 ; 135.83,-124.02 117.72,-104.33 ; 135.83,155.51 117.72,135.83 ; 155.51,-104.33 135.83,-86.22 ; 155.51,135.83 135.83,117.72 ; -104.33,-88.58 -104.33,117.72 ; -104.33,-88.58 -86.22,-104.33 ; -104.33,117.72 -86.22,135.83 ; -86.22,-104.33 117.72,-104.33 ; -86.22,135.83 117.72,135.83 ; 117.72,-104.33 135.83,-86.22 ; 117.72,135.83 135.83,117.72 ; 135.83,-86.22 135.83,117.72
  lines w6: -124.02,-104.33 -104.33,-124.02 135.83,-124.02 155.51,-104.33 155.51,135.83 135.83,155.51 -104.33,155.51 -124.02,135.83 -124.02,-104.33
Mechanical 16:
  rectangle: -100.39,155.51 -88.58,234.25
  rectangle: -68.9,155.51 -57.09,234.25
  rectangle: -37.4,155.51 -25.59,234.25
  rectangle: -5.91,155.51 5.91,234.25
  rectangle: 25.59,155.51 37.4,234.25
  rectangle: 57.09,155.51 68.9,234.25
  rectangle: 88.58,155.51 100.39,234.25
  rectangle: 120.08,155.51 131.89,234.25
  rectangle: 155.51,120.08 234.25,131.89
  rectangle: 155.51,88.58 234.25,100.39
  rectangle: 155.51,57.09 234.25,68.9
  rectangle: 155.51,25.59 234.25,37.4
  rectangle: 155.51,-5.91 234.25,5.91
  rectangle: 155.51,-37.4 234.25,-25.59
  rectangle: 155.51,-68.9 234.25,-57.09
  rectangle: 155.51,-100.39 234.25,-88.58
  rectangle: 120.08,-202.76 131.89,-124.02
  rectangle: 88.58,-202.76 100.39,-124.02
  rectangle: 57.09,-202.76 68.9,-124.02
  rectangle: 25.59,-202.76 37.4,-124.02
  rectangle: -5.91,-202.76 5.91,-124.02
  rectangle: -37.4,-202.76 -25.59,-124.02
  rectangle: -68.9,-202.76 -57.09,-124.02
  rectangle: -100.39,-202.76 -88.58,-124.02
  rectangle: -202.76,-100.39 -124.02,-88.58
  rectangle: -202.76,-68.9 -124.02,-57.09
  rectangle: -202.76,-37.4 -124.02,-25.59
  rectangle: -202.76,-5.91 -124.02,5.91
  rectangle: -202.76,25.59 -124.02,37.4
  rectangle: -202.76,57.09 -124.02,68.9
  rectangle: -202.76,88.58 -124.02,100.39
  rectangle: -202.76,120.08 -124.02,131.89